# Altium footprint library lib_protel_HC_BOINA.PCBLIB: 726 footprints (part 23 of 46)
Each footprint in its own frame and in the unit in brackets; x right, y up, seen from the top. Pads: shape width x height; smd on the part's side, far side on the other; paste and mask are expansions set on the pad; w line width, h text height; cw(c..) or ccw(c..) is an arc to the next point about the centre after c.
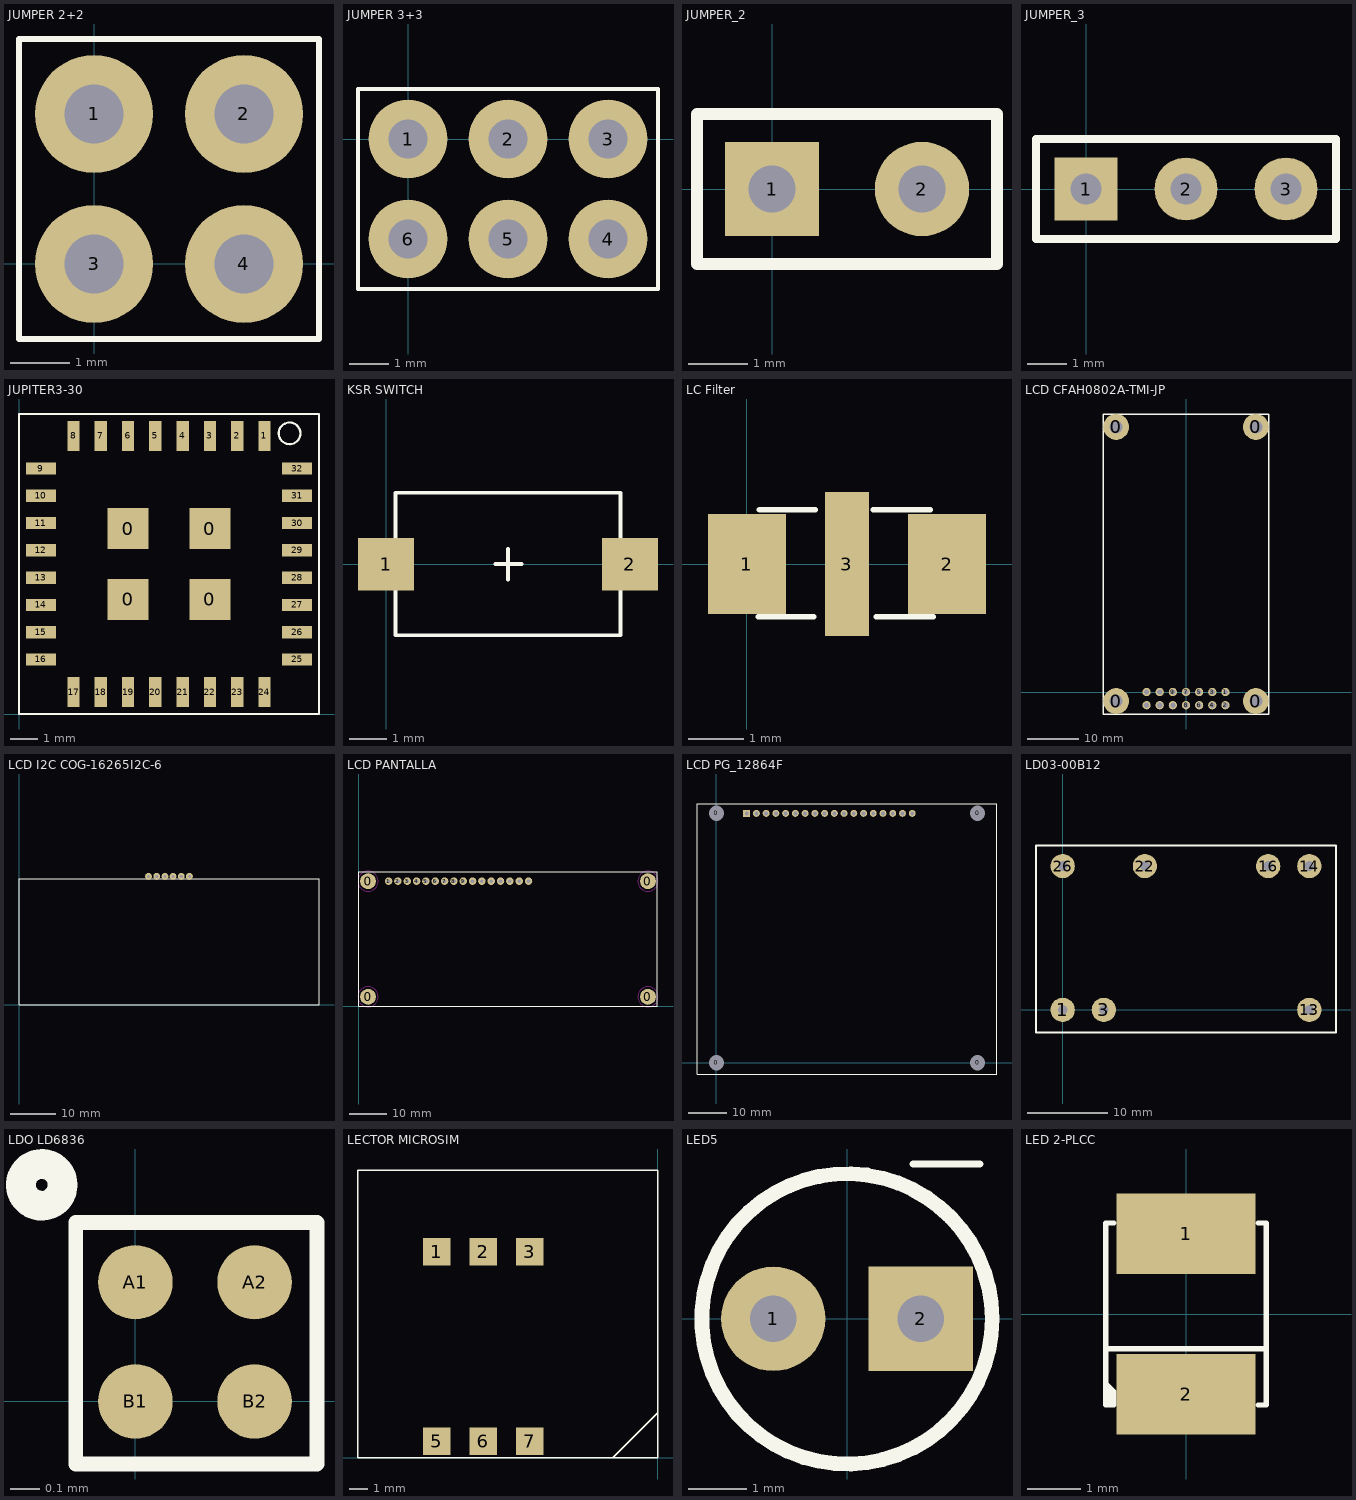
[diagram p22: the footprints below, top view; thin cyan lines are the x and y axes]

## JUMPER 2+2 [mm]
pads (4):
  round 2 hole 1: 1(0,2.54) 2(2.54,2.54) 3(0,0) 4(2.54,0)
Top Overlay:
  lines w0.1: -1.27,-1.27 -1.27,3.81 3.81,3.81 3.81,-1.27 -1.27,-1.27

## JUMPER 3+3 [mm]
height 11.04
pads (6):
  round 2 hole 1: 1(0,0) 2(2.54,0) 3(5.08,0) 4(5.08,-2.54) 5(2.54,-2.54) 6(0,-2.54)
Top Overlay:
  lines w0.1: -1.27,-3.81 6.35,-3.81 6.35,1.27 -1.27,1.27 -1.27,-3.81

## JUMPER_2 [mm] "jumper de 2 pines"
height 9
pads (2):
  rect 1.6x1.6 hole 0.8: 1(0,0)
  round 1.6 hole 0.8: 2(2.54,0)
Top Overlay:
  lines w0.2: -1.27,-1.27 3.81,-1.27 3.81,1.27 -1.27,1.27 -1.27,-1.27

## JUMPER_3 [mm] "jumper de 3 pines"
height 9
pads (3):
  rect 1.6x1.6 hole 0.8: 1(0,0)
  round 1.6 hole 0.8: 2(2.54,0) 3(5.08,0)
Top Overlay:
  lines w0.2: -1.27,-1.27 6.35,-1.27 6.35,1.27 -1.27,1.27 -1.27,-1.27

## JUPITER3-30 [mm] "GPS J3-30"
height 2.25
pads (36):
  rect 1.5x1.5 smd: 0(4,4.2) 0(4,6.8) 0(7,4.2) 0(7,6.8)
  rect 0.45x1.1 smd: 1(9,10.2) 2(8,10.2) 3(7,10.2) 4(6,10.2) 5(5,10.2) 6(4,10.2) 7(3,10.2) 8(2,10.2) 17(2,0.8) 18(3,0.8) 19(4,0.8) 20(5,0.8) 21(6,0.8) 22(7,0.8) 23(8,0.8) 24(9,0.8)
  rect 1.1x0.45 smd: 9(0.8,9) 10(0.8,8) 11(0.8,7) 12(0.8,6) 13(0.8,5) 14(0.8,4) 15(0.8,3) 16(0.8,2) 25(10.2,2) 26(10.2,3) 27(10.2,4) 28(10.2,5) 29(10.2,6) 30(10.2,7) 31(10.2,8) 32(10.2,9)
Top Overlay:
  circle w0.08: c9.922,10.29 r0.398
  lines w0.08: 0,0 0,11 11,11 11,0 0,0

## KSR SWITCH [mm] "MICROPULSADOR"
height 2.489
pads (2):
  rect 1.5x1.4 smd: 1(0,0) 2(6.5,0)
Top Overlay:
  lines w0.102: 2.91,0 3.61,0 ; 3.25,-0.42 3.25,0.4 3.25,0 ; 0.25,-1.9 6.25,-1.9 6.25,1.9 0.25,1.9 0.25,-1.9

## LC Filter [mm] "Filtro LCL"
pads (3):
  rect 1.4x1.8 smd paste+0.1 mask+0.1: 1(0,0) 2(3.6,0)
  rect 0.8x2.6 smd paste+0.1 mask+0.1: 3(1.8,0)
Top Overlay:
  lines w0.1: 0.2,-0.95 1.2,-0.95 ; 0.225,0.975 1.225,0.975 ; 2.275,0.975 3.3,0.975 ; 2.325,-0.95 3.35,-0.95

## LCD CFAH0802A-TMI-JP [mm] "Conector pantalla LCD CFAH0802A-TMI-JP"
height 11.04
pads (18):
  round 5 hole 2.5: 0(-13.5,-1.74) 0(-13.5,51.26) 0(13.5,-1.74) 0(13.5,51.26)
  round 1.6 hole 1: 1(7.62,0) 2(7.62,-2.54) 3(5.08,0) 4(5.08,-2.54) 5(2.54,0) 6(2.54,-2.54) 7(0,0) 8(0,-2.54) 9(-2.54,0) 10(-2.54,-2.54) 11(-5.08,0) 12(-5.08,-2.54) 13(-7.62,0) 14(-7.62,-2.54)
Top Overlay:
  lines w0.254: -16,-4.24 16,-4.24 16,53.76 -16,53.76 -16,-4.24

## LCD I2C COG-16265I2C-6 [mm]
pads (6):
  round 1.5 hole 0.7: 1(28.48,28.29) 2(30.29,28.29) 3(32.11,28.29) 4(33.89,28.29) 5(35.7,28.29) 6(37.49,28.29)
Top Overlay:
  lines w0.203: 0,0 0,27.8 66,27.8 66,0 0,0

## LCD PANTALLA [mm]
pads (20):
  round 4.25 all layers, no hole: 0(2.5,2.5) 0(2.5,33.5) 0(77.5,2.5) 0(77.5,33.5)
  round 2 hole 1: 1(8,33.5) 2(10.5,33.5) 3(13,33.5) 4(15.5,33.5) 5(18,33.5) 6(20.5,33.5) 7(23,33.5) 8(25.5,33.5) 9(28,33.5) 10(30.5,33.5) 11(33,33.5) 12(35.5,33.5) 13(38,33.5) 14(40.5,33.5) 15(43,33.5) 16(45.5,33.5)
Top Overlay:
  lines w0.203: 0,0 0,36 80,36 80,0 0,0
Keep-Out Layer:
  circle w0.1: c77.5,33.5 r2.7
  circle w0.1: c77.5,2.5 r2.7
  circle w0.1: c2.5,2.5 r2.7
  circle w0.1: c2.5,33.5 r2.7

## LCD PG_12864F [mm] "LCD MATRICIAL"
pads (22):
  oval 2.8x2 on Top hole 4: 0(0,0) 0(0,65.024) 0(68.072,0) 0(68.072,65.024)
  rect 1.8x1.8 hole 1: 1(7.874,65.024)
  round 1.8 hole 1: 2(10.414,65.024) 3(12.954,65.024) 4(15.494,65.024) 5(18.034,65.024) 6(20.574,65.024) 7(23.114,65.024) 8(25.654,65.024) 9(28.194,65.024) 10(30.734,65.024) 11(33.274,65.024) 12(35.814,65.024) 13(38.354,65.024) 14(40.894,65.024) 15(43.434,65.024) 16(45.974,65.024) 17(48.514,65.024) 18(51.054,65.024)
Top Overlay:
  lines w0.127: -5.08,-3.048 -5.08,67.564 73.152,67.564 73.152,-3.048 -5.08,-3.048

## LD03-00B12 [mm] "CONVERSOR AC/DC 12V 250mA"
height 15
pads (7):
  round 3 hole 1.2: 1(0,0) 3(5.08,0) 13(30.48,0) 14(30.48,17.78) 16(25.4,17.78) 22(10.16,17.78) 26(0,17.78)
Top Overlay:
  lines w0.254: -3.302,-2.794 33.782,-2.794 33.782,20.32 -3.302,20.32 -3.302,-2.794

## LDO LD6836 [mm] "LD6836 WLCSP4"
height 0.5
pads (4):
  round 0.25 smd mask+0.04: A1(0,0.4) A2(0.4,0.4) B1(0,0) B2(0.4,0)
Top Overlay:
  circle w0.1: c-0.314,0.727 r0.07
  lines w0.05: -0.2,-0.21 0.61,-0.21 0.61,0.6 -0.2,0.6 -0.2,-0.21
3D body: height 0.5, standoff 0, extent -0.2,-0.21 0.61,0.6

## LECTOR MICROSIM [mm] "LECTOR DE TARJETAS MICROSIM"
height 2.85
pads (6):
  rect 1.5x1.5 smd: 1(-12.1,11.26) 2(-9.56,11.26) 3(-7.02,11.26) 5(-12.1,0.9) 6(-9.56,0.9) 7(-7.02,0.9)
Top Overlay:
  lines w0.08: -2.76,0 -2.46,0 0,2.46 ; -16.4,0 0,0 0,15.7 -16.4,15.7 -16.4,0

## LED5 [mm] "LED 5mm"
pads (2):
  round 1.8 hole 0.8: 1(-1.27,0)
  rect 1.8x1.8 hole 0.8: 2(1.27,0)
Top Overlay:
  circle w0.254: c0,0 r2.5
  lines w0.127: 1.143,2.667 2.286,2.667

## LED 2-PLCC [mm] "LED SMD"
pads (2):
  rect 2.6x1.5 smd mask+0.1: 1(0,1.5) 2(0,-1.5)
Top Overlay:
  rectangle: -1.5,-1.7 -1.35,-1.4
  lines w0.1: -1.5,-1.3 -1.35,-1.45 -1.35,-1.7 -1.5,-1.7 -1.5,1.7 -1.35,1.7 ; -1.5,-0.65 1.5,-0.65 ; 1.35,-1.7 1.5,-1.7 1.5,1.7 1.35,1.7
3D body "User Library-HSMx-A10x-xxxxx SMD LED PLCC-2.STEP": height 1.9, standoff 0, extent -1.4,-1.75 1.4,1.75